# Altium schematic symbol library IC_TI.SCHLIB: 1162 symbols (part 8 of 8)
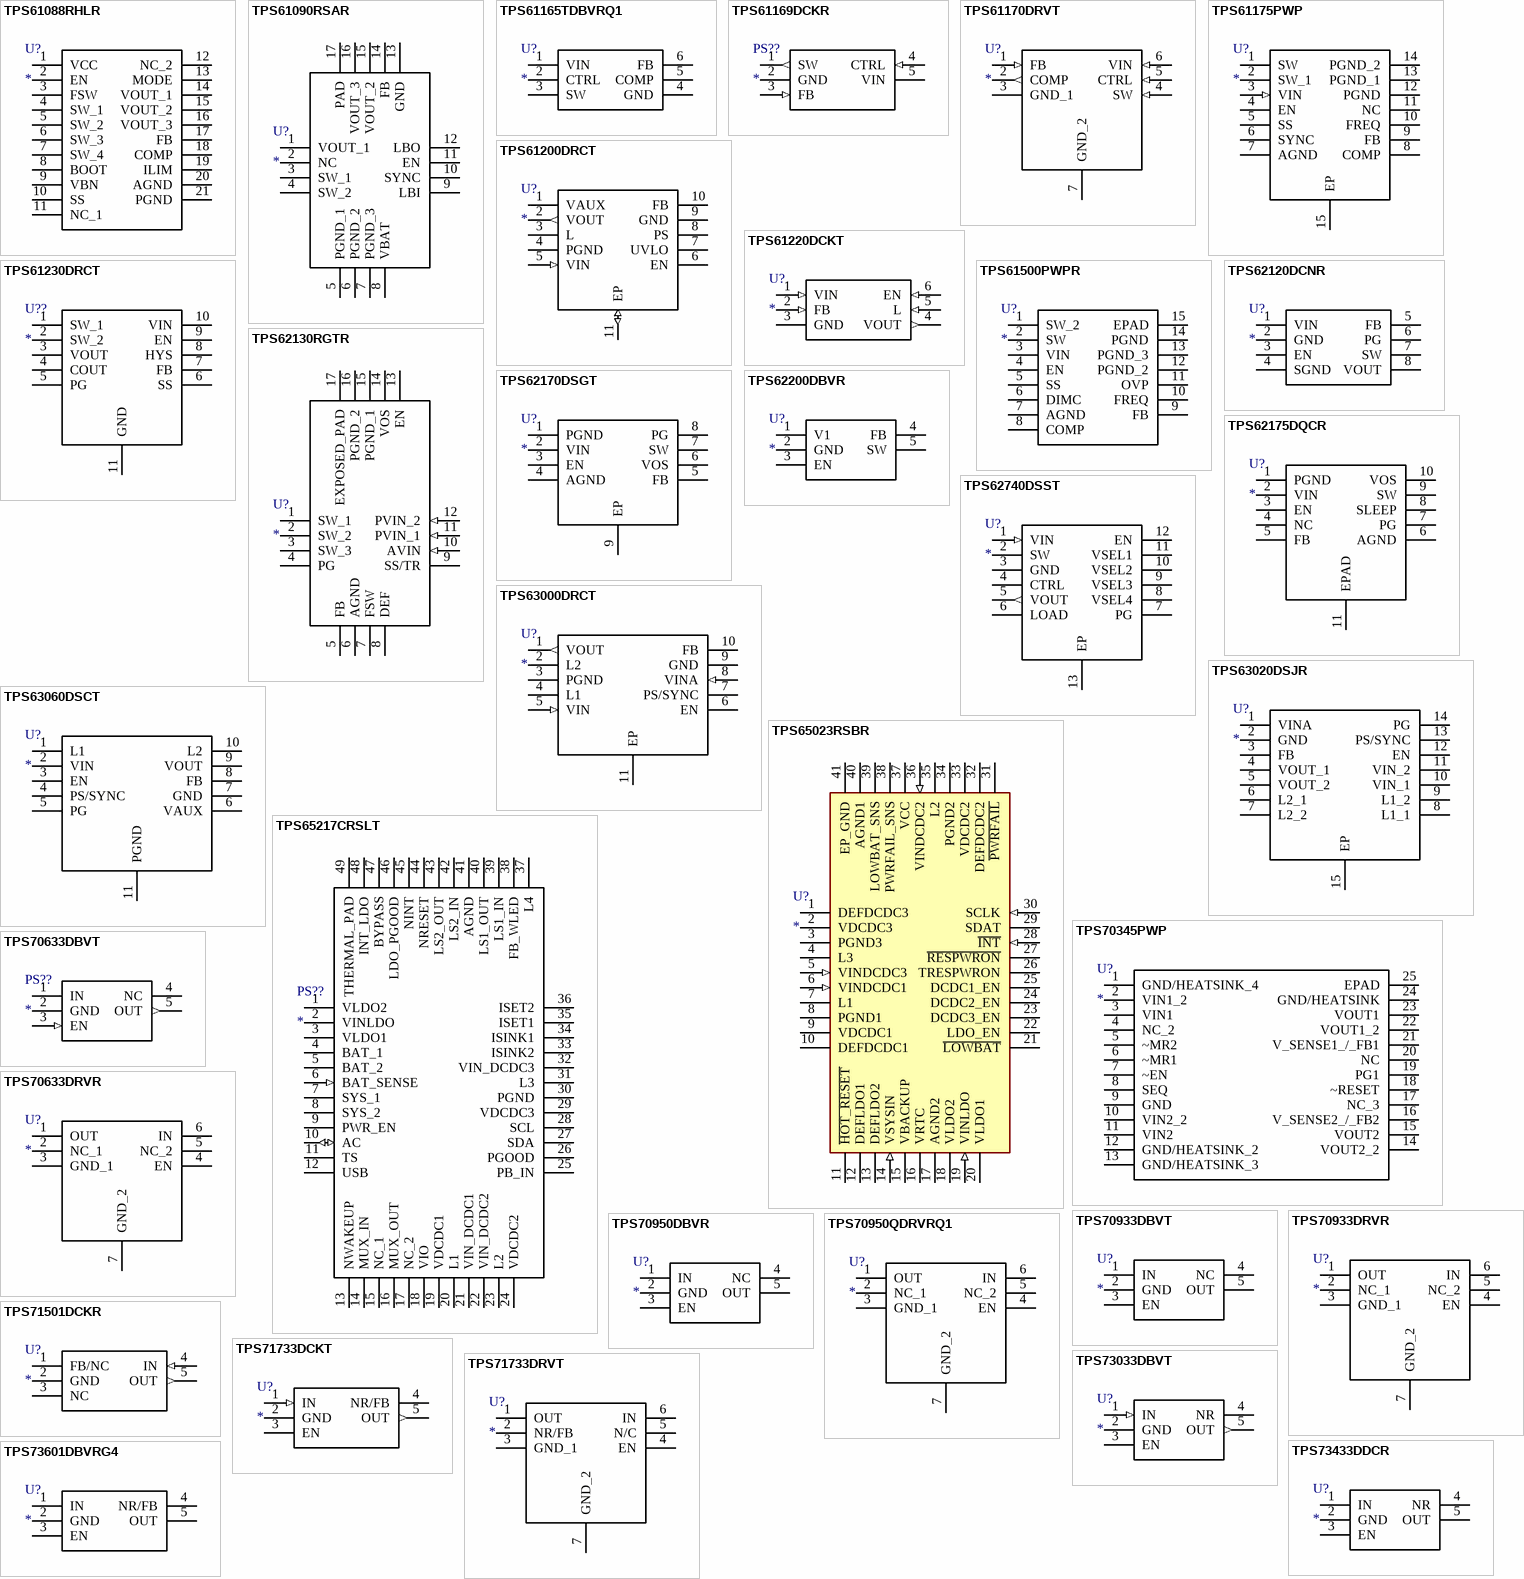
[diagram p42: symbols TPS61088RHLR to TPS73601DBVRG4]

## TPS73433DDCR
designator U?
Integrated Circuit; Manufacturer_Name: Texas Instruments; Manufacturer_Part_Number: TPS73433DDCR; Mouser Part Number: 595-TPS73433DDCR; Mouser Price/Stock: https://www.mouser.com/Search/Refine.aspx?Keyword=595-TPS73433DDCR
footprint SOT23-5 (SOT23, 5-Leads, Body 3.0x3.0mm (max), Pitch 0.95mm, IPC Medium Density)
pins: 1 IN, 2 GND, 3 EN, 4 NR, 5 OUT

## TPS73601DBVRG4
designator U?
Integrated Circuit; Manufacturer_Name: Texas Instruments; Manufacturer_Part_Number: TPS73601DBVRG4; Datasheet Link: http://www.ti.com/lit/ds/symlink/tps736.pdf; Height: 1.45mm; Mouser Part Number: 595-TPS73601DBVRG4; Mouser Price/Stock: https://www.mouser.com/Search/Refine.aspx?Keyword=595-TPS73601DBVRG4
footprint SOT23-5 (SOT23, 5-Leads, Body 3.0x3.0mm (max), Pitch 0.95mm, IPC Medium Density)
pins: 1 IN, 2 GND, 3 EN, 4 NR/FB, 5 OUT

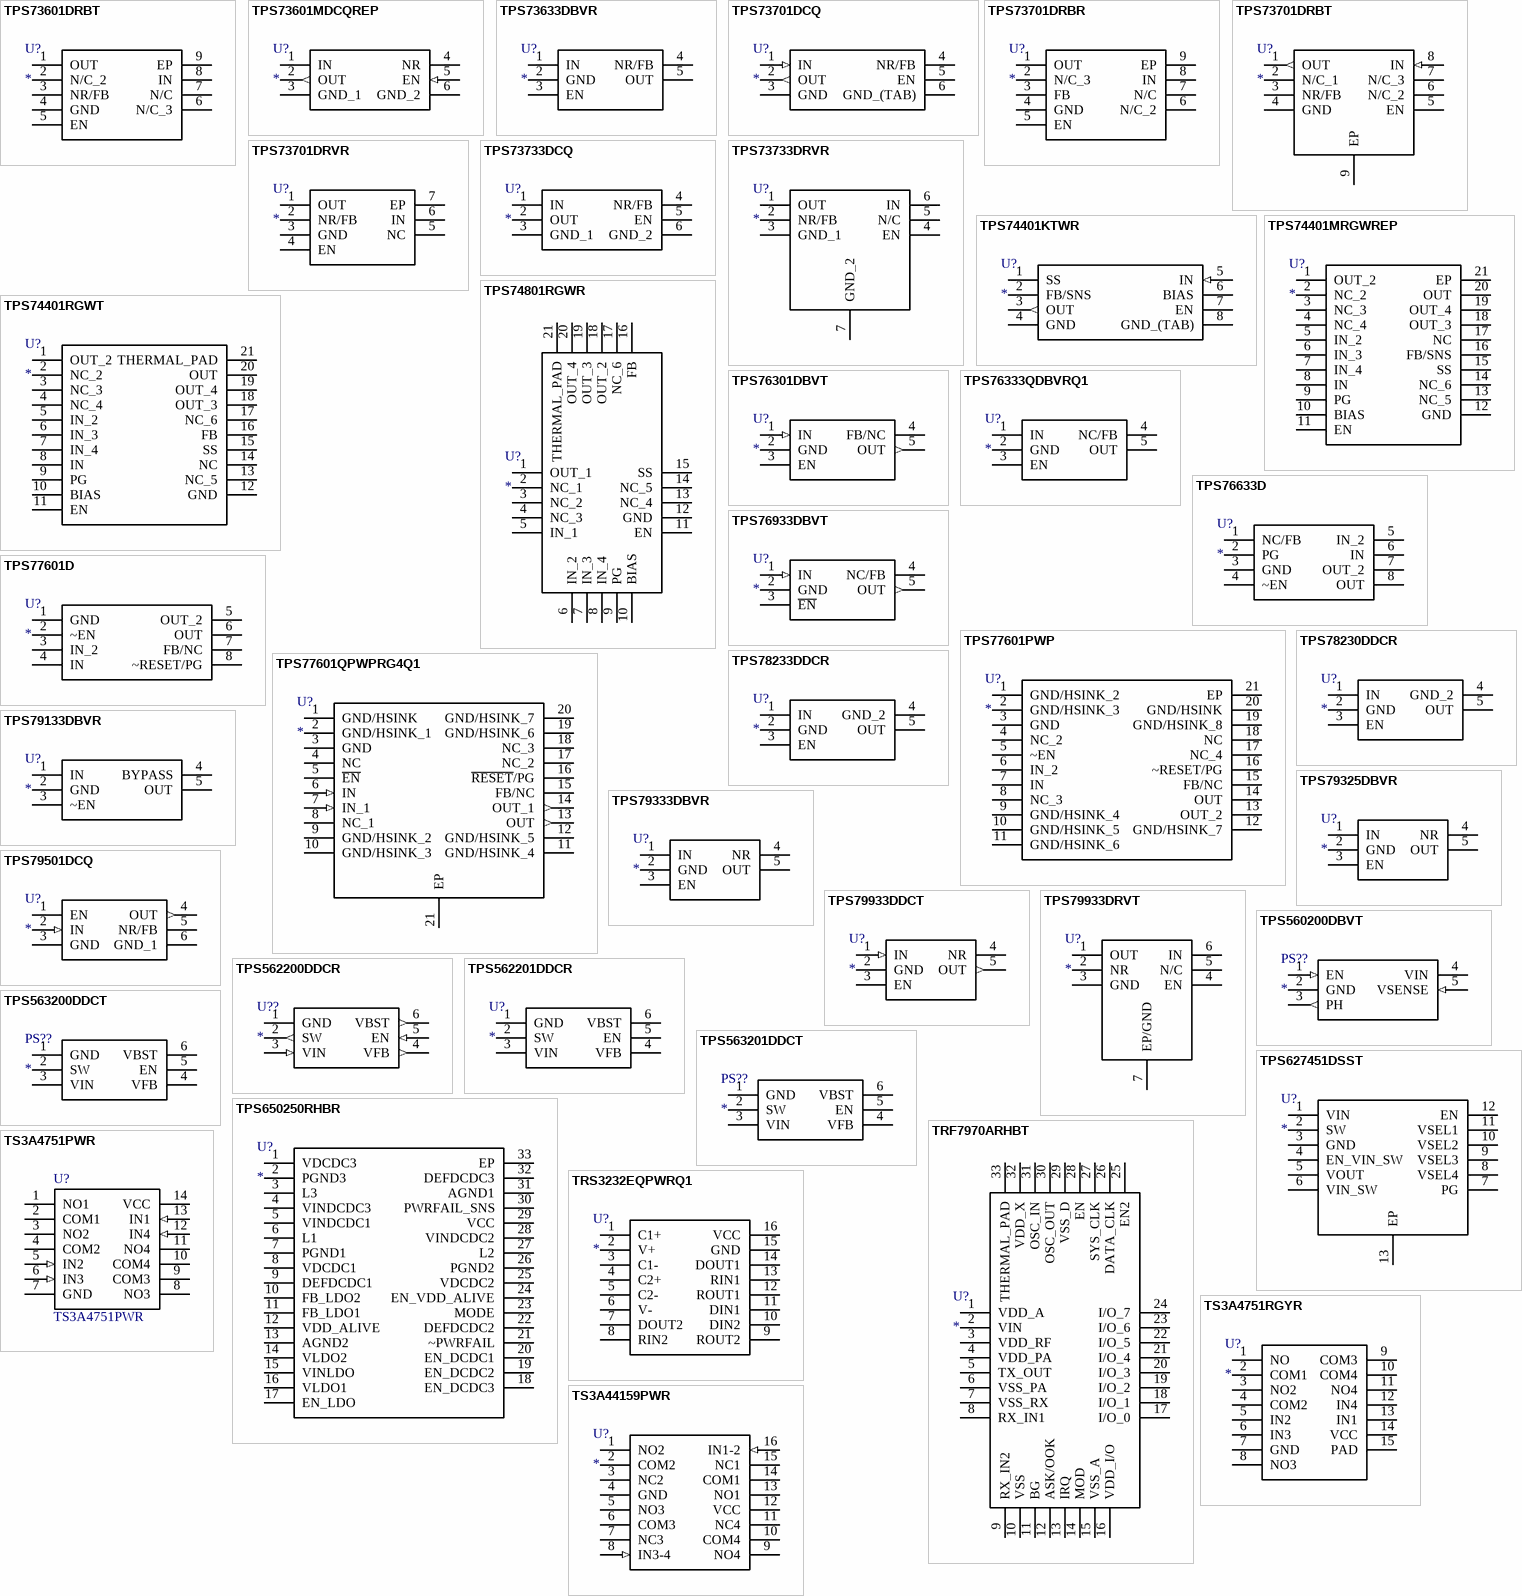
[diagram p33: symbols TPS73601DRBT to TS3A44159PWR]

## TPS73601DRBT
designator U?
Integrated Circuit; Manufacturer_Name: Texas Instruments; Manufacturer_Part_Number: TPS73601DRBT; Datasheet Link: http://www.ti.com/lit/gpn/tps736; Mouser Part Number: 595-TPS73601DRBT; Mouser Price/Stock: https://www.mouser.com/Search/Refine.aspx?Keyword=595-TPS73601DRBT; RS Part Number: 1457762; RS Price/Stock: http://uk.rs-online.com/web/p/products/1457762
footprint HVSON8_0.65-PAD
pins: 1 OUT, 2 N/C_2, 3 NR/FB, 4 GND, 5 EN, 6 N/C_3, 7 N/C, 8 IN, 9 EP

## TPS73601MDCQREP
designator U?
Integrated Circuit; Manufacturer_Name: Texas Instruments; Manufacturer_Part_Number: TPS73601MDCQREP; Datasheet Link: http://www.ti.com/lit/gpn/tps73601-ep; Height: 1.8mm; Mouser Part Number: 595-TPS73601MDCQREP; Mouser Price/Stock: https://www.mouser.com/Search/Refine.aspx?Keyword=595-TPS73601MDCQREP
footprint SOT223-6
pins: 1 IN (power), 2 OUT (out), 3 GND_1 (power), 4 NR, 5 EN (in), 6 GND_2 (power)

## TPS73633DBVR
designator U?
Integrated Circuit; Manufacturer_Name: Texas Instruments; Manufacturer_Part_Number: TPS73633DBVR; Datasheet Link: http://www.ti.com/lit/gpn/tps736; Height: 1.45mm; Mouser Part Number: 595-TPS73633DBVR; Mouser Price/Stock: https://www.mouser.com/Search/Refine.aspx?Keyword=595-TPS73633DBVR
footprint SOT23-5 (SOT23, 5-Leads, Body 3.0x3.0mm (max), Pitch 0.95mm, IPC Medium Density)
pins: 1 IN, 2 GND, 3 EN, 4 NR/FB, 5 OUT

## TPS73701DCQ
designator U?
Integrated Circuit; Manufacturer_Name: Texas Instruments; Manufacturer_Part_Number: TPS73701DCQ; Datasheet Link: http://www.ti.com/lit/ds/symlink/tps737.pdf; Height: 1.8mm; Mouser Part Number: 595-TPS73701DCQ; Mouser Price/Stock: https://www.mouser.com/Search/Refine.aspx?Keyword=595-TPS73701DCQ; RS Part Number: 9232385; RS Price/Stock: http://uk.rs-online.com/web/p/products/9232385
footprint SOT223-6
pins: 1 IN (in), 2 OUT (out), 3 GND (power), 4 NR/FB, 5 EN, 6 GND_(TAB) (power)

## TPS73701DRBR
designator U?
Integrated Circuit; Manufacturer_Name: Texas Instruments; Manufacturer_Part_Number: TPS73701DRBR; Datasheet Link: http://componentsearchengine.com/Datasheets/1/TPS73701DRBR.pdf; Mouser Part Number: 595-TPS73701DRBR; Mouser Price/Stock: https://www.mouser.com/Search/Refine.aspx?Keyword=595-TPS73701DRBR
footprint HVSON8_0.65-PAD
pins: 1 OUT, 2 N/C_3, 3 FB, 4 GND, 5 EN, 6 N/C_2, 7 N/C, 8 IN, 9 EP

## TPS73701DRBT
designator U?
Integrated Circuit; Manufacturer_Name: Texas Instruments; Manufacturer_Part_Number: TPS73701DRBT; Datasheet Link: http://docs-emea.rs-online.com/webdocs/0cbc/0900766b80cbc2de.pdf; Height: 1mm; Mouser Part Number: 595-TPS73701DRBT; Mouser Price/Stock: https://www.mouser.com/Search/Refine.aspx?Keyword=595-TPS73701DRBT; RS Part Number: 1788982; RS Price/Stock: http://uk.rs-online.com/web/p/products/1788982
footprint HVSON8_0.65-PAD
pins: 1 OUT (out), 2 N/C_1, 3 NR/FB, 4 GND (power), 5 EN, 6 N/C_2, 7 N/C_3, 8 IN (in), 9 EP

## TPS73701DRVR
designator U?
Integrated Circuit; Manufacturer_Name: Texas Instruments; Manufacturer_Part_Number: TPS73701DRVR; Datasheet Link: http://www.ti.com/lit/gpn/tps737; Mouser Part Number: 595-TPS73701DRVR; Mouser Price/Stock: https://www.mouser.com/Search/Refine.aspx?Keyword=595-TPS73701DRVR
footprint DFN6_0.65-PAD(2.2X2.5)
pins: 1 OUT, 2 NR/FB, 3 GND, 4 EN, 5 NC, 6 IN, 7 EP

## TPS73733DCQ
designator U?
Integrated Circuit; Manufacturer_Name: Texas Instruments; Manufacturer_Part_Number: TPS73733DCQ; Datasheet Link: http://www.ti.com/lit/gpn/tps737; Height: 1.8mm; Mouser Part Number: 595-TPS73733DCQ; Mouser Price/Stock: https://www.mouser.com/Search/Refine.aspx?Keyword=595-TPS73733DCQ; RS Part Number: 8175405P; RS Price/Stock: http://uk.rs-online.com/web/p/products/8175405P
footprint SOT223-6
pins: 1 IN, 2 OUT, 3 GND_1, 4 NR/FB, 5 EN, 6 GND_2

## TPS73733DRVR
designator U?
Integrated Circuit; Manufacturer_Name: Texas Instruments; Manufacturer_Part_Number: TPS73733DRVR; Datasheet Link: http://www.ti.com/lit/gpn/tps737; Height: 0.8mm; Mouser Part Number: 595-TPS73733DRVR; Mouser Price/Stock: https://www.mouser.com/Search/Refine.aspx?Keyword=595-TPS73733DRVR
footprint DFN6_0.65-PAD(2.2X2.5)
pins: 1 OUT, 2 NR/FB, 3 GND_1, 4 EN, 5 N/C, 6 IN, 7 GND_2

## TPS74401KTWR
designator U?
Integrated Circuit; Manufacturer_Name: Texas Instruments; Manufacturer_Part_Number: TPS74401KTWR; Datasheet Link: http://www.ti.com/lit/ds/symlink/tps74401.pdf; Height: 4.65mm; Mouser Part Number: 595-TPS74401KTWR; Mouser Price/Stock: https://www.mouser.com/Search/Refine.aspx?Keyword=595-TPS74401KTWR; RS Part Number: 9223410; RS Price/Stock: http://uk.rs-online.com/web/p/products/9223410
footprint TO263-7A
pins: 1 SS, 2 FB/SNS, 3 OUT (out), 4 GND (power), 5 IN (in), 6 BIAS, 7 EN, 8 GND_(TAB) (power)

## TPS74401MRGWREP
designator U?
Integrated Circuit; Manufacturer_Name: Texas Instruments; Manufacturer_Part_Number: TPS74401MRGWREP; Datasheet Link: http://www.ti.com/lit/gpn/tps74401-ep; Mouser Part Number: 595-TPS74401MRGWREP; Mouser Price/Stock: https://www.mouser.com/Search/Refine.aspx?Keyword=595-TPS74401MRGWREP
footprint QFN20_0.65-PAD(5X5)
pins: 1 OUT_2, 2 NC_2, 3 NC_3, 4 NC_4, 5 IN_2, 6 IN_3, 7 IN_4, 8 IN, 9 PG, 10 BIAS, 11 EN, 12 GND, 13 NC_5, 14 NC_6, 15 SS, 16 FB/SNS, 17 NC, 18 OUT_3, 19 OUT_4, 20 OUT, 21 EP

## TPS74401RGWT
designator U?
Integrated Circuit; Manufacturer_Name: Texas Instruments; Manufacturer_Part_Number: TPS74401RGWT; Datasheet Link: http://www.ti.com/lit/gpn/tps74401; Mouser Part Number: 595-TPS74401RGWT; Mouser Price/Stock: https://www.mouser.com/Search/Refine.aspx?Keyword=595-TPS74401RGWT; RS Part Number: 6614065P; RS Price/Stock: http://uk.rs-online.com/web/p/products/6614065P
footprint QFN20_0.65-PAD(5X5)
pins: 1 OUT_2, 2 NC_2, 3 NC_3, 4 NC_4, 5 IN_2, 6 IN_3, 7 IN_4, 8 IN, 9 PG, 10 BIAS, 11 EN, 12 GND, 13 NC_5, 14 NC, 15 SS, 16 FB, 17 NC_6, 18 OUT_3, 19 OUT_4, 20 OUT, 21 THERMAL_PAD

## TPS74801RGWR
designator U?
Integrated Circuit; Manufacturer_Name: Texas Instruments; Manufacturer_Part_Number: TPS74801RGWR; Datasheet Link: http://www.ti.com/lit/gpn/tps74801; Height: 1mm; Mouser Part Number: 595-TPS74801RGWR; Mouser Price/Stock: https://www.mouser.com/Search/Refine.aspx?Keyword=595-TPS74801RGWR
footprint QFN20_0.65-PAD(5X5)
pins: 1 OUT_1, 2 NC_1, 3 NC_2, 4 NC_3, 5 IN_1, 6 IN_2, 7 IN_3, 8 IN_4, 9 PG, 10 BIAS, 11 EN, 12 GND, 13 NC_4, 14 NC_5, 15 SS, 16 FB, 17 NC_6, 18 OUT_2, 19 OUT_3, 20 OUT_4, 21 THERMAL_PAD

## TPS76301DBVT
designator U?
Integrated Circuit; Manufacturer_Name: Texas Instruments; Manufacturer_Part_Number: TPS76301DBVT; Datasheet Link: http://www.ti.com/lit/ds/symlink/tps76301.pdf; Height: 1.45mm; Mouser Part Number: 595-TPS76301DBVT; Mouser Price/Stock: https://www.mouser.com/Search/Refine.aspx?Keyword=595-TPS76301DBVT; RS Part Number: 0389205P; RS Price/Stock: http://uk.rs-online.com/web/p/products/0389205P
footprint SOT23-5 (SOT23, 5-Leads, Body 3.0x3.0mm (max), Pitch 0.95mm, IPC Medium Density)
pins: 1 IN (in), 2 GND (power), 3 EN, 4 FB/NC, 5 OUT (out)

## TPS76333QDBVRQ1
designator U?
Integrated Circuit; Manufacturer_Name: Texas Instruments; Manufacturer_Part_Number: TPS76333QDBVRQ1; Datasheet Link: http://www.ti.com/lit/gpn/tps763-q1; Height: 1.45mm; Mouser Part Number: 595-TPS76333QDBVRQ1; Mouser Price/Stock: https://www.mouser.com/Search/Refine.aspx?Keyword=595-TPS76333QDBVRQ1
footprint SOT23-5 (SOT23, 5-Leads, Body 3.0x3.0mm (max), Pitch 0.95mm, IPC Medium Density)
pins: 1 IN, 2 GND, 3 EN, 4 NC/FB, 5 OUT

## TPS76633D
designator U?
Integrated Circuit; Manufacturer_Name: Texas Instruments; Manufacturer_Part_Number: TPS76633D; Datasheet Link: http://www.ti.com/lit/gpn/tps766; Mouser Part Number: 595-TPS76633D; Mouser Price/Stock: https://www.mouser.com/Search/Refine.aspx?Keyword=595-TPS76633D; RS Part Number: 1456523; RS Price/Stock: http://uk.rs-online.com/web/p/products/1456523
footprint SOIC8_1.27 (SOP, 8-Leads, Pitch 1.27mm)
pins: 1 NC/FB, 2 PG, 3 GND, 4 ~EN, 5 IN_2, 6 IN, 7 OUT_2, 8 OUT

## TPS76933DBVT
designator U?
Integrated Circuit; Manufacturer_Name: Texas Instruments; Manufacturer_Part_Number: TPS76933DBVT; Datasheet Link: http://www.ti.com/lit/ds/symlink/tps76933.pdf; Height: 1.45mm; Mouser Part Number: 595-TPS76933DBVT; Mouser Price/Stock: https://www.mouser.com/Search/Refine.aspx?Keyword=595-TPS76933DBVT; RS Part Number: 5171422P; RS Price/Stock: http://uk.rs-online.com/web/p/products/5171422P
footprint SOT23-5 (SOT23, 5-Leads, Body 3.0x3.0mm (max), Pitch 0.95mm, IPC Medium Density)
pins: 1 IN (in), 2 GND (power), 3 ~{EN}, 4 NC/FB, 5 OUT (out)

## TPS77601D
designator U?
Integrated Circuit; Manufacturer_Name: Texas Instruments; Manufacturer_Part_Number: TPS77601D; Datasheet Link: http://www.ti.com/lit/gpn/tps776; Mouser Part Number: 595-TPS77601D; Mouser Price/Stock: https://www.mouser.com/Search/Refine.aspx?Keyword=595-TPS77601D; RS Part Number: 1791769; RS Price/Stock: http://uk.rs-online.com/web/p/products/1791769
footprint SOIC8_1.27 (SOP, 8-Leads, Pitch 1.27mm)
pins: 1 GND, 2 ~EN, 3 IN_2, 4 IN, 5 OUT_2, 6 OUT, 7 FB/NC, 8 ~RESET/PG

## TPS77601PWP
designator U?
Integrated Circuit; Manufacturer_Name: Texas Instruments; Manufacturer_Part_Number: TPS77601PWP; Datasheet Link: http://www.ti.com/lit/gpn/tps776; Mouser Part Number: 595-TPS77601PWP; Mouser Price/Stock: https://www.mouser.com/Search/Refine.aspx?Keyword=595-TPS77601PWP; RS Part Number: 6616597; RS Price/Stock: http://uk.rs-online.com/web/p/products/6616597
footprint TSSOP20_0.65-PAD (TSOP, 20-Leads, Body 6.6x4.5mm (max), Pitch 0.65mm, IPC Medium Density)
pins: 1 GND/HSINK_2, 2 GND/HSINK_3, 3 GND, 4 NC_2, 5 ~EN, 6 IN_2, 7 IN, 8 NC_3, 9 GND/HSINK_4, 10 GND/HSINK_5, 11 GND/HSINK_6, 12 GND/HSINK_7, 13 OUT_2, 14 OUT, 15 FB/NC, 16 ~RESET/PG, 17 NC_4, 18 NC, 19 GND/HSINK_8, 20 GND/HSINK, 21 EP

## TPS77601QPWPRG4Q1
designator U?
Integrated Circuit; Manufacturer_Name: Texas Instruments; Manufacturer_Part_Number: TPS77601QPWPRG4Q1; Datasheet Link: http://docs-emea.rs-online.com/webdocs/0f6d/0900766b80f6d115.pdf; Height: 1.2mm; Mouser Part Number: 595-PS77601QPWPRG4Q1; Mouser Price/Stock: https://www.mouser.com/Search/Refine.aspx?Keyword=595-PS77601QPWPRG4Q1; RS Part Number: 7321219P; RS Price/Stock: http://uk.rs-online.com/web/p/products/7321219P
footprint TSSOP20_0.65-PAD (TSOP, 20-Leads, Body 6.6x4.5mm (max), Pitch 0.65mm, IPC Medium Density)
pins: 1 GND/HSINK (power), 2 GND/HSINK_1 (power), 3 GND (power), 4 NC, 5 ~{EN}, 6 IN (in), 7 IN_1 (in), 8 NC_1, 9 GND/HSINK_2 (power), 10 GND/HSINK_3 (power), 11 GND/HSINK_4 (power), 12 GND/HSINK_5 (power), 13 OUT (out), 14 OUT_1 (out), 15 FB/NC, 16 ~{RESET}/PG, 17 NC_2, 18 NC_3, 19 GND/HSINK_6 (power), 20 GND/HSINK_7 (power), 21 EP

## TPS78230DDCR
designator U?
Integrated Circuit; Manufacturer_Name: Texas Instruments; Manufacturer_Part_Number: TPS78230DDCR; Datasheet Link: http://www.ti.com/lit/gpn/tps782; Mouser Part Number: 595-TPS78230DDCR; Mouser Price/Stock: https://www.mouser.com/Search/Refine.aspx?Keyword=595-TPS78230DDCR
footprint SOT23-5 (SOT23, 5-Leads, Body 3.0x3.0mm (max), Pitch 0.95mm, IPC Medium Density)
pins: 1 IN, 2 GND, 3 EN, 4 GND_2, 5 OUT

## TPS78233DDCR
designator U?
Integrated Circuit; Manufacturer_Name: Texas Instruments; Manufacturer_Part_Number: TPS78233DDCR; Datasheet Link: http://www.ti.com/lit/gpn/tps782; Mouser Part Number: 595-TPS78233DDCR; Mouser Price/Stock: https://www.mouser.com/Search/Refine.aspx?Keyword=595-TPS78233DDCR
footprint SOT23-5 (SOT23, 5-Leads, Body 3.0x3.0mm (max), Pitch 0.95mm, IPC Medium Density)
pins: 1 IN, 2 GND, 3 EN, 4 GND_2, 5 OUT

## TPS79133DBVR
designator U?
Integrated Circuit; Manufacturer_Name: Texas Instruments; Manufacturer_Part_Number: TPS79133DBVR; Datasheet Link: http://www.ti.com/lit/gpn/tps791; Mouser Part Number: 595-TPS79133DBVR; Mouser Price/Stock: https://www.mouser.com/Search/Refine.aspx?Keyword=595-TPS79133DBVR
footprint SOT23-5 (SOT23, 5-Leads, Body 3.0x3.0mm (max), Pitch 0.95mm, IPC Medium Density)
pins: 1 IN, 2 GND, 3 ~EN, 4 BYPASS, 5 OUT

## TPS79325DBVR
designator U?
Integrated Circuit; Manufacturer_Name: Texas Instruments; Manufacturer_Part_Number: TPS79325DBVR; Datasheet Link: http://www.ti.com/lit/gpn/tps793; Mouser Part Number: 595-TPS79325DBVR; Mouser Price/Stock: https://www.mouser.com/Search/Refine.aspx?Keyword=595-TPS79325DBVR; RS Part Number: 6614481P; RS Price/Stock: http://uk.rs-online.com/web/p/products/6614481P
footprint SOT23-5 (SOT23, 5-Leads, Body 3.0x3.0mm (max), Pitch 0.95mm, IPC Medium Density)
pins: 1 IN, 2 GND, 3 EN, 4 NR, 5 OUT

## TPS79333DBVR
designator U?
Integrated Circuit; Manufacturer_Name: Texas Instruments; Manufacturer_Part_Number: TPS79333DBVR; Datasheet Link: http://www.ti.com/lit/gpn/tps793; Mouser Part Number: 595-TPS79333DBVR; Mouser Price/Stock: https://www.mouser.com/Search/Refine.aspx?Keyword=595-TPS79333DBVR; RS Part Number: 1219149; RS Price/Stock: http://uk.rs-online.com/web/p/products/1219149
footprint SOT23-5 (SOT23, 5-Leads, Body 3.0x3.0mm (max), Pitch 0.95mm, IPC Medium Density)
pins: 1 IN, 2 GND, 3 EN, 4 NR, 5 OUT

## TPS79501DCQ
designator U?
Integrated Circuit; Manufacturer_Name: Texas Instruments; Manufacturer_Part_Number: TPS79501DCQ; Datasheet Link: http://www.ti.com/lit/ds/symlink/tps79501.pdf; Height: 1.8mm; Mouser Part Number: 595-TPS79501DCQ; Mouser Price/Stock: https://www.mouser.com/Search/Refine.aspx?Keyword=595-TPS79501DCQ; RS Part Number: 4624256; RS Price/Stock: http://uk.rs-online.com/web/p/products/4624256
footprint SOT223-6
pins: 1 EN, 2 IN (in), 3 GND (power), 4 OUT (out), 5 NR/FB, 6 GND_1 (power)

## TPS79933DDCT
designator U?
Integrated Circuit; Manufacturer_Name: Texas Instruments; Manufacturer_Part_Number: TPS79933DDCT; Datasheet Link: http://www.ti.com/lit/ds/symlink/tps79933.pdf; Height: 1.1mm; Mouser Part Number: 595-TPS79933DDCT; Mouser Price/Stock: https://www.mouser.com/Search/Refine.aspx?Keyword=595-TPS79933DDCT; RS Part Number: 5458381P; RS Price/Stock: http://uk.rs-online.com/web/p/products/5458381P
footprint SOT23-5 (SOT23, 5-Leads, Body 3.0x3.0mm (max), Pitch 0.95mm, IPC Medium Density)
pins: 1 IN (in), 2 GND (power), 3 EN, 4 NR, 5 OUT (out)

## TPS79933DRVT
designator U?
Integrated Circuit; Manufacturer_Name: Texas Instruments; Manufacturer_Part_Number: TPS79933DRVT; Datasheet Link: http://www.ti.com/lit/ds/symlink/tps799.pdf; Height: 0.8mm; Mouser Part Number: 595-TPS79933DRVT; Mouser Price/Stock: https://www.mouser.com/Search/Refine.aspx?Keyword=595-TPS79933DRVT; RS Part Number: 1788987; RS Price/Stock: http://uk.rs-online.com/web/p/products/1788987
footprint DFN6_0.65-PAD(2.2X2.5)
pins: 1 OUT, 2 NR, 3 GND, 4 EN, 5 N/C, 6 IN, 7 EP/GND

## TPS560200DBVT
designator PS??
Power Supply; Manufacturer_Name: Texas Instruments; Manufacturer_Part_Number: TPS560200DBVT; Datasheet Link: http://www.ti.com/lit/gpn/tps560200; Height: 1.45mm; Mouser Part Number: 595-TPS560200DBVT; Mouser Price/Stock: https://www.mouser.com/Search/Refine.aspx?Keyword=595-TPS560200DBVT
footprint SOT23-5 (SOT23, 5-Leads, Body 3.0x3.0mm (max), Pitch 0.95mm, IPC Medium Density)
pins: 1 EN (in), 2 GND (power), 3 PH (out), 4 VIN (power), 5 VSENSE (in)

## TPS562200DDCR
designator U??
Undefined or Miscellaneous; Manufacturer_Name: Texas Instruments; Manufacturer_Part_Number: TPS562200DDCR; Datasheet Link: http://www.ti.com/lit/gpn/tps562200; Height: 1.1mm; Mouser Part Number: 595-TPS562200DDCR; Mouser Price/Stock: https://www.mouser.com/Search/Refine.aspx?Keyword=595-TPS562200DDCR
footprint SOT23-6
pins: 1 GND (power), 2 SW (out), 3 VIN (in), 4 VFB (out), 5 EN (in), 6 VBST (out)

## TPS562201DDCR
designator U?
Integrated Circuit; Manufacturer_Name: Texas Instruments; Manufacturer_Part_Number: TPS562201DDCR; Datasheet Link: http://www.ti.com/lit/gpn/tps562201; Height: 1.1mm; Mouser Part Number: 595-TPS562201DDCR; Mouser Price/Stock: https://www.mouser.com/Search/Refine.aspx?Keyword=595-TPS562201DDCR
footprint SOT23-6
pins: 1 GND, 2 SW, 3 VIN, 4 VFB, 5 EN, 6 VBST

## TPS563200DDCT
designator PS??
Power Supply; Manufacturer_Name: Texas Instruments; Manufacturer_Part_Number: TPS563200DDCT; Datasheet Link: http://www.ti.com/lit/gpn/tps563200; Height: 1.1mm; Mouser Part Number: 595-TPS563200DDCT; Mouser Price/Stock: https://www.mouser.com/Search/Refine.aspx?Keyword=595-TPS563200DDCT; RS Part Number: 9143109P; RS Price/Stock: http://uk.rs-online.com/web/p/products/9143109P
footprint SOT23-6
pins: 1 GND, 2 SW, 3 VIN, 4 VFB, 5 EN, 6 VBST

## TPS563201DDCT
designator PS??
Power Supply; Manufacturer_Name: Texas Instruments; Manufacturer_Part_Number: TPS563201DDCT; Datasheet Link: http://www.ti.com/general/docs/lit/getliterature.tsp?genericPartNumber=tps563201&fileType=pdf; Height: 1.1mm; Mouser Part Number: 595-TPS563201DDCT; Mouser Price/Stock: https://www.mouser.com/Search/Refine.aspx?Keyword=595-TPS563201DDCT
footprint SOT23-6
pins: 1 GND, 2 SW, 3 VIN, 4 VFB, 5 EN, 6 VBST

## TPS627451DSST
designator U?
Integrated Circuit; Manufacturer_Name: Texas Instruments; Manufacturer_Part_Number: TPS627451DSST; Datasheet Link: http://www.ti.com/general/docs/lit/getliterature.tsp?genericPartNumber=TPS627451&&fileType=pdf; Height: 0.8mm; Mouser Part Number: 595-TPS627451DSST; Mouser Price/Stock: https://www.mouser.com/Search/Refine.aspx?Keyword=595-TPS627451DSST; RS Part Number: 1685085; RS Price/Stock: http://uk.rs-online.com/web/p/products/1685085
footprint DFN12_0.5-PAD(3X2)
pins: 1 VIN, 2 SW, 3 GND, 4 EN_VIN_SW, 5 VOUT, 6 VIN_SW, 7 PG, 8 VSEL4, 9 VSEL3, 10 VSEL2, 11 VSEL1, 12 EN, 13 EP

## TPS650250RHBR
designator U?
Integrated Circuit; Manufacturer_Name: Texas Instruments; Manufacturer_Part_Number: TPS650250RHBR; Mouser Part Number: 595-TPS650250RHBR; Mouser Price/Stock: https://www.mouser.com/Search/Refine.aspx?Keyword=595-TPS650250RHBR
footprint QFN32_0.5-PAD(5X5) (QFN, 32-Leads, Body 5.2x5.2mm (max), Pitch 0.50mm, IPC Medium Density)
pins: 1 VDCDC3, 2 PGND3, 3 L3, 4 VINDCDC3, 5 VINDCDC1, 6 L1, 7 PGND1, 8 VDCDC1, 9 DEFDCDC1, 10 FB_LDO2, 11 FB_LDO1, 12 VDD_ALIVE, 13 AGND2, 14 VLDO2, 15 VINLDO, 16 VLDO1, 17 EN_LDO, 18 EN_DCDC3, 19 EN_DCDC2, 20 EN_DCDC1, 21 ~PWRFAIL, 22 DEFDCDC2, 23 MODE, 24 EN_VDD_ALIVE, 25 VDCDC2, 26 PGND2, 27 L2, 28 VINDCDC2, 29 VCC, 30 PWRFAIL_SNS, 31 AGND1, 32 DEFDCDC3, 33 EP

## TRF7970ARHBT
designator U?
Integrated Circuit; Manufacturer_Name: Texas Instruments; Manufacturer_Part_Number: TRF7970ARHBT; Datasheet Link: http://www.ti.com/lit/gpn/trf7970a; Height: 1mm; Mouser Part Number: 595-TRF7970ARHBT; Mouser Price/Stock: https://www.mouser.com/Search/Refine.aspx?Keyword=595-TRF7970ARHBT; RS Part Number: 7968442P; RS Price/Stock: http://uk.rs-online.com/web/p/products/7968442P
footprint QFN32_0.5-PAD(5X5) (QFN, 32-Leads, Body 5.2x5.2mm (max), Pitch 0.50mm, IPC Medium Density)
pins: 1 VDD_A, 2 VIN, 3 VDD_RF, 4 VDD_PA, 5 TX_OUT, 6 VSS_PA, 7 VSS_RX, 8 RX_IN1, 9 RX_IN2, 10 VSS, 11 BG, 12 ASK/OOK, 13 IRQ, 14 MOD, 15 VSS_A, 16 VDD_I/O, 17 I/O_0, 18 I/O_1, 19 I/O_2, 20 I/O_3, 21 I/O_4, 22 I/O_5, 23 I/O_6, 24 I/O_7, 25 EN2, 26 DATA_CLK, 27 SYS_CLK, 28 EN, 29 VSS_D, 30 OSC_OUT, 31 OSC_IN, 32 VDD_X, 33 THERMAL_PAD

## TRS3232EQPWRQ1
designator U?
Integrated Circuit; Manufacturer_Name: Texas Instruments; Manufacturer_Part_Number: TRS3232EQPWRQ1; Datasheet Link: http://www.ti.com/lit/gpn/trs3232e-q1; Mouser Part Number: 595-TRS3232EQPWRQ1; Mouser Price/Stock: https://www.mouser.com/Search/Refine.aspx?Keyword=595-TRS3232EQPWRQ1
footprint TSSOP16_0.65 (Shrink Small Outline; 16 Leads; Body Width 4.4 mm; Pitch 0.65 mm)
pins: 1 C1+, 2 V+, 3 C1-, 4 C2+, 5 C2-, 6 V-, 7 DOUT2, 8 RIN2, 9 ROUT2, 10 DIN2, 11 DIN1, 12 ROUT1, 13 RIN1, 14 DOUT1, 15 GND, 16 VCC

## TS3A4751PWR
designator U?
Integrated Circuit; Manufacturer_Name: Texas Instruments; Datasheet Link: http://www.ti.com/lit/ds/symlink/ts3a4751.pdf; Height: 1.2mm; Manufacturer_Part_Number: TS3A4751PWR; Mouser Part Number: 595-TS3A4751PWR; Mouser Price/Stock: https://www.mouser.com/Search/Refine.aspx?Keyword=595-TS3A4751PWR; RS Part Number: 1627186; RS Price/Stock: http://uk.rs-online.com/web/p/products/1627186
footprint TSSOP14_0.65 (TSOP, 14-Leads, Body 5.00x4.40mm, Pitch 0.65mm, Thermal Pad 2.31x2.46mm, IPC Low Density)
pins: 1 NO1, 2 COM1, 3 NO2, 4 COM2, 5 IN2 (in), 6 IN3 (in), 7 GND (power), 8 NO3, 9 COM3, 10 COM4, 11 NO4, 12 IN4 (in), 13 IN1 (in), 14 VCC (power)

## TS3A4751RGYR
designator U?
Integrated Circuit; Manufacturer_Name: Texas Instruments; Manufacturer_Part_Number: TS3A4751RGYR; Datasheet Link: http://www.ti.com/lit/ds/symlink/ts3a4751.pdf; Mouser Part Number: 595-TS3A4751RGYR; Mouser Price/Stock: https://www.mouser.com/Search/Refine.aspx?Keyword=595-TS3A4751RGYR; RS Part Number: 1628844; RS Price/Stock: http://uk.rs-online.com/web/p/products/1628844
footprint QFN14_0.5-PAD(3.5X3.5)
pins: 1 NO, 2 COM1, 3 NO2, 4 COM2, 5 IN2, 6 IN3, 7 GND, 8 NO3, 9 COM3, 10 COM4, 11 NO4, 12 IN4, 13 IN1, 14 VCC, 15 PAD

## TS3A44159PWR
designator U?
Integrated Circuit; Manufacturer_Name: Texas Instruments; Manufacturer_Part_Number: TS3A44159PWR; Datasheet Link: http://www.ti.com/lit/ds/symlink/ts3a44159.pdf; Height: 1.2mm; Mouser Part Number: 595-TS3A44159PWR; Mouser Price/Stock: https://www.mouser.com/Search/Refine.aspx?Keyword=595-TS3A44159PWR; RS Part Number: 1626472; RS Price/Stock: http://uk.rs-online.com/web/p/products/1626472
footprint TSSOP16_0.65 (Shrink Small Outline; 16 Leads; Body Width 4.4 mm; Pitch 0.65 mm)
pins: 1 NO2, 2 COM2, 3 NC2, 4 GND (power), 5 NO3, 6 COM3, 7 NC3, 8 IN3-4 (in), 9 NO4, 10 COM4, 11 NC4, 12 VCC (power), 13 NO1, 14 COM1, 15 NC1, 16 IN1-2 (in)
